# Altium footprint library connector.PcbLib: 189 footprints (part 4 of 12)
Each footprint in its own frame and in the unit in brackets; x right, y up, seen from the top. Pads: shape width x height; smd on the part's side, far side on the other; paste and mask are expansions set on the pad; w line width, h text height; cw(c..) or ccw(c..) is an arc to the next point about the centre after c.
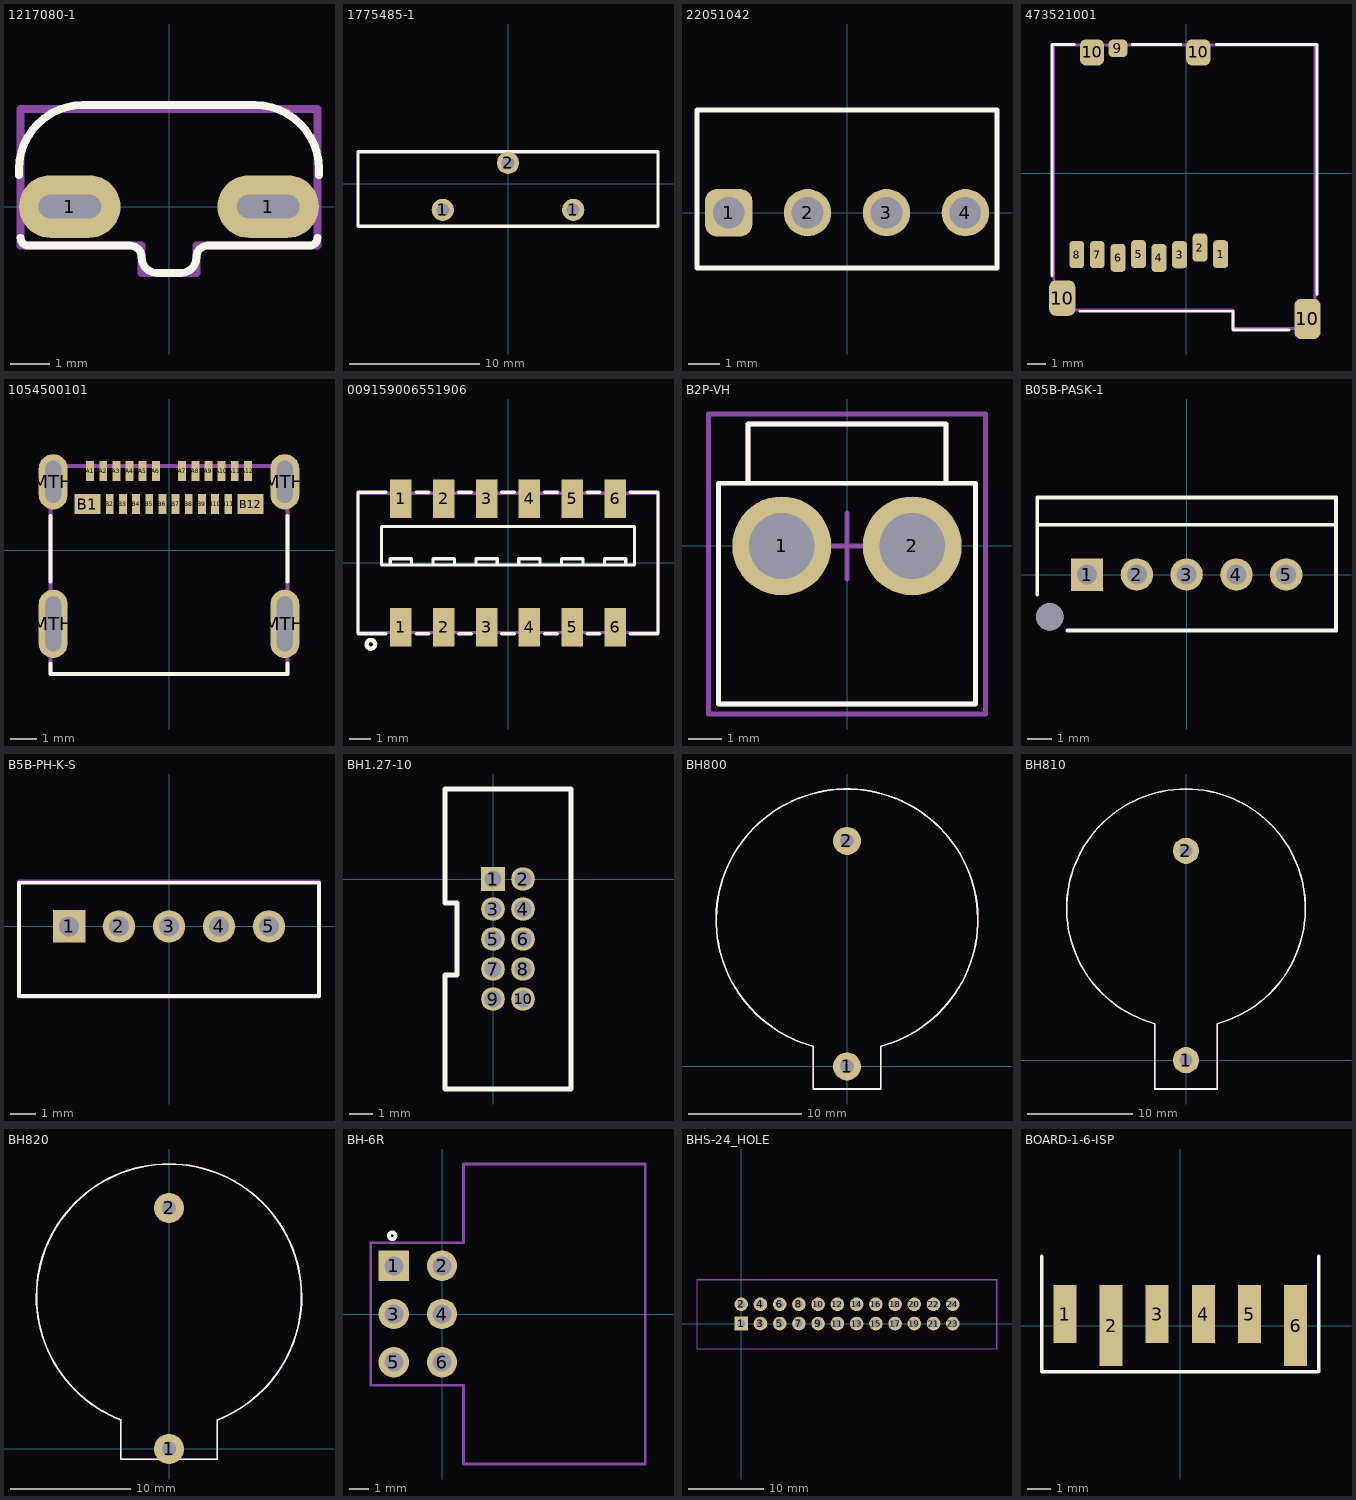
[diagram p3: the footprints below, top view; thin cyan lines are the x and y axes]

## 1217080-1 [mm]
pads (2):
  oval 2.6x1.6 hole 0.6 slot 1.6 at 0 deg: 1(-2.54,0) 1(2.54,0)
Top Overlay:
  lines w0.2: -3.84,0.8 -3.84,0.96 cw(c-2.2,0.96) -2.2,2.6 0.1,2.6 ; -3.8,-0.8 ccw(c-3.6,-0.8) -3.6,-1 -1.24,-1 -1,-1 cw(c-1,-1.3) -0.7,-1.3 ccw(c-0.3,-1.3) -0.3,-1.7 0,-1.7 0.3,-1.7 ccw(c0.3,-1.3) 0.7,-1.3 cw(c1,-1.3) 1,-1 1.24,-1 3.6,-1 ccw(c3.6,-0.8) 3.8,-0.8 ; -0.1,2.6 2.2,2.6 cw(c2.2,0.96) 3.84,0.96 3.84,0.8
Top Courtyard:
  lines w0.2: -3.8,-1 -3.8,2.5 0,2.5 3.8,2.5 3.8,-1 0.7,-1 0.7,-1.7 0,-1.7 -0.7,-1.7 -0.7,-1 -3.8,-1
3D body "1217080-1.stp": height 9.91, standoff -3.81, extent -3.699,-1.675 3.794,2.567

## 1775485-1 [mm]
height 18.5
pads (3):
  round 1.7 hole 1: 1(-5,-2) 1(5,-2) 2(0,1.6)
Top Overlay:
  lines w0.254: -11.5,-3.25 -11.5,0 -11.5,2.45 0.55,2.45 11.5,2.45 11.5,0 11.5,-3.25 -0.25,-3.25 -11.5,-3.25
3D body "User Library-TE_2-1775485-1_CR2032_bat_vert_holder.step": height 18.5, standoff -4, extent -11.5,-3.35 11.5,2.45

## 22051042 [mm]
height 6.3
pads (4):
  rrect50% 1.5x1.5 hole 1: 1(-3.75,0)
  round 1.5 hole 1: 2(-1.25,0) 3(1.25,0) 4(3.75,0)
Top Overlay:
  lines w0.15: -4.75,-1.75 4.75,-1.75 4.75,3.25 4.5,3.25 -4.75,3.25 -4.75,0 -4.75,-1.75
3D body "022051042.stp": height 6.47, standoff -3.25, extent -4.75,-10.1 4.75,3.2

## 473521001 [mm]
pads (13):
  rrect50% 0.8x1.5 smd: 1(1.831,-4.34) 2(0.727,-3.985) 4(-1.473,-4.538) 5(-2.567,-4.333) 6(-3.665,-4.534)
  rrect50% 0.8x1.45 smd: 3(-0.368,-4.367) 7(-4.779,-4.36) 8(-5.876,-4.356)
  rrect50% 1x0.95 smd: 9(-3.667,6.693)
  rrect50% 1.4x1.9 smd: 10(-6.656,-6.688)
  rrect50% 1.3x1.4 smd: 10(-5.059,6.475) 10(0.64,6.471)
  rrect50% 1.4x2.15 smd: 10(6.485,-7.808)
Top Overlay:
  lines w0.15: -7.2,-5.5 -7.2,6.9 -6,6.9 ; -5.7,-7.4 2.5,-7.4 2.5,-8.4 5.5,-8.4 ; -2.9,6.9 -0.3,6.9 ; 1.6,6.9 7,6.9 7,-6.5
Top Courtyard:
  lines w0.15: -7.11,-7.326 2.5,-7.326 2.5,-8.325 6.892,-8.325 6.892,6.875 -7.11,6.875 -7.11,-7.326
3D body "473521001.stp": height 1.95, standoff 0.07, extent -7.157,-8.273 6.943,6.927

## 1054500101 [mm]
height 3.3
pads (28):
  rect 0.3x0.76 smd: A1(-3,3) A2(-2.5,3) A3(-2,3) A4(-1.5,3) A5(-1,3) A6(-0.5,3) A7(0.5,3) A8(1,3) A9(1.5,3) A10(2,3) A11(2.5,3) A12(3,3) B2(-2.25,1.75) B3(-1.75,1.75) B4(-1.25,1.75) B5(-0.75,1.75) B6(-0.25,1.75) B7(0.25,1.75) B8(0.75,1.75) B9(1.25,1.75) B10(1.75,1.75) B11(2.25,1.75)
  rect 1x0.76 smd: B1(-3.1,1.75) B12(3.1,1.75)
  oval 1.1x2.6 hole 0.6 slot 2.1 at 90 deg: MTH(-4.4,-2.8) MTH(4.4,-2.8)
  oval 1.1x2.1 hole 0.6 slot 1.6 at 90 deg: MTH(-4.4,2.6) MTH(4.4,2.6)
Top Overlay:
  lines w0.15: -4.5,-4.3 -4.5,-4.7 0,-4.7 4.5,-4.7 4.5,-4.3 ; -4.5,-1.2 -4.5,1.3 ; 4.5,-1.2 4.5,1.3
Top Courtyard:
  lines w0.15: -4.5,-4.7 -4.5,3.2 4.5,3.2 4.5,-4.7 -4.5,-4.7
3D body "1054500101.stp": height 3.18, standoff -0.78, extent -4.47,-4.7 4.47,3.2

## 009159006551906 [mm]
height 5
pads (12):
  rect 1x1.8 smd: 1(-5,-3) 1(-5,3) 2(-3,-3) 2(-3,3) 3(-1,-3) 3(-1,3) 4(1,-3) 4(1,3) 5(3,-3) 5(3,3) 6(5,-3) 6(5,3)
Top Overlay:
  circle w0.2: c-6.4,-3.8 r0.2
  lines w0.15: -5.7,-3.3 -7,-3.3 -7,0.1 -7,3.3 -5.7,3.3 ; -5.487,-0.1 -5.5,-0.1 -5.5,0.2 -4.5,0.2 -4.5,-0.1 ; -4.3,-3.3 -3.7,-3.3 ; -4.3,3.3 -3.7,3.3 ; -3.5,-0.1 -3.5,0.2 -2.5,0.2 -2.5,-0.1 ; -2.3,-3.3 -1.7,-3.3 ; -2.3,3.3 -1.7,3.3 ; -1.5,-0.1 -1.5,0.2 -0.5,0.2 -0.5,-0.1 ; -0.3,-3.3 0.3,-3.3 ; -0.3,3.3 0.3,3.3 ; 0.5,-0.1 0.5,0.2 1.5,0.2 1.5,-0.1 ; 1.7,-3.3 2.3,-3.3 ; 1.7,3.3 2.3,3.3 ; 2.5,-0.1 2.5,0.2 3.5,0.2 3.5,-0.1 ; 3.7,-3.3 4.3,-3.3 ; 3.7,3.3 4.3,3.3 ; 4.5,-0.1 4.5,0.2 5.5,0.2 5.5,-0.1 ; 5.7,-3.3 7,-3.3 7,0.1 7,3.3 5.7,3.3 ; -5.9,-0.1 -5.9,1.7 0,1.7 5.9,1.7 5.9,-0.1 -0.2,-0.1 -5.9,-0.1
Top Courtyard:
  lines w0.15: -7,-3.25 -7,3.25 7,3.25 7,-3.25 -7,-3.25
3D body "AVX-00-9159-006-551-906.STEP": height 5.1, standoff 0.05, extent -7,-3.75 7,3.75

## B2P-VH [mm]
height 11
pads (2):
  round 3 hole 2: 1(-1.98,0) 2(1.98,0)
Top Overlay:
  lines w0.15: -3,1.9 -3,3.7 3,3.7 3,1.9 ; -3.9,1.9 3.9,1.9 ; -3.9,1.9 -3.9,-4.8 3.9,-4.8 3.9,1.9 ; -3.9,1.9 3.9,1.9
Mechanical 15:
  lines w0.15: -1,0 1,0 ; 0,-1 0,1 ; -4.2,-5.1 4.2,-5.1 4.2,4 -4.2,4 -4.2,-5.1
Mechanical 29:
  lines w0.15: -3,1.9 -3,3.7 3,3.7 3,1.9 ; -3.9,1.9 3.9,1.9 ; -3.9,1.9 -3.9,-4.8 3.9,-4.8 3.9,1.9 ; -3.9,1.9 3.9,1.9
  text ".Designator" at -3,-1.8 h1
3D body "B2P-VH-BK.STEP": height 10.9, standoff -3.7, extent -3.93,-4.65 3.93,3.85

## B05B-PASK-1 [mm]
pads (6):
  rect 1.3x1.3 hole 0.8: 1(-4,0)
  round 1.3 hole 0.8: 2(-2,0) 3(0,0) 4(2,0) 5(4,0)
  round 1.1 hole 1.1 unplated: ""(-5.5,-1.7)
Top Overlay:
  lines w0.15: -6,-0.8 -6,2 ; -4.8,-2.25 6,-2.25 6,2 ; -6,2 -6,3.1 0,3.1 6,3.1 6,2 ; -6,2 6,2
  text "." at -5,2.5 h0.1
3D body "B05B-PASK-1.STEP": height 7.85, standoff -2.85, extent -6,-2.2 6,3.1

## B5B-PH-K-S [mm]
pads (5):
  rect 1.3x1.3 hole 0.8: 1(-4,0)
  round 1.3 hole 0.8: 2(-2,0) 3(0,0) 4(2,0) 5(4,0)
Top Overlay:
  lines w0.15: -6,-2.775 6,-2.775 6,1.75 -6,1.75 -6,-2.775
Top Courtyard:
  lines w0.15: -6,-2.8 -6,1.8 6,1.8 6,-2.8 -6,-2.8
3D body "B5B-PH-K-S.STEP": height 6, standoff -3.4, extent -5.95,-2.75 5.95,1.75

## BH1.27-10 [mm] "BH1.27-10"
pads (10):
  rect 1x1 hole 0.7: 1(0,0)
  round 1 hole 0.7: 2(1.27,0) 3(0,-1.27) 4(1.27,-1.27) 5(0,-2.54) 6(1.27,-2.54) 7(0,-3.81) 8(1.27,-3.81) 9(0,-5.08) 10(1.27,-5.08)
Top Overlay:
  lines w0.2: -2.032,-8.89 -2.032,-4.064 -1.524,-4.064 -1.524,-1.016 -2.032,-1.016 -2.032,3.81 3.302,3.81 3.302,-8.89 -2.032,-8.89
3D body "CONB127P-2R-10W_TH.STEP": height 5.4, standoff -2.1, extent -2.015,-8.865 3.185,3.785

## BH800 [mm]
height 6.6
pads (2):
  round 2.5 hole 1.2: 1(0,0) 2(0,20)
Top Overlay:
  lines w0.15: -3.001,1.795 cw(c0,13) 3.001,1.795 ; -3,1.8 -3,-2 3,-2 3,1.8
Top Courtyard:
  lines w0.15: -3.001,1.795 cw(c0,13) 3.001,1.795 ; -3,1.8 -3,-2 3,-2 3,1.8
3D body: height 8.2, standoff 0, extent -11.6,1.403 11.6,24.597
3D body: height 8.2, standoff 0, extent -3,-2 3,3.5

## BH810 [mm]
height 6.6
pads (2):
  round 2.5 hole 1.2: 1(0,0) 2(0,20)
Top Overlay:
  lines w0.15: -3,3.5 -3,-2.75 3,-2.75 3,3.5 ; -3,3.502 cw(c0,14.5) 3,3.502
Top Courtyard:
  lines w0.15: -3,3.5 -3,-2.75 3,-2.75 3,3.5 ; -3,3.502 cw(c0,14.5) 3,3.502
3D body "User Library-BATTERY HOLDER CR2032.step": height 7.41, standoff -3.5, extent -11.5,-2.75 11.5,25.75

## BH820 [mm]
height 6.6
pads (2):
  round 2.5 hole 1.2: 1(0,0) 2(0,20)
Top Overlay:
  lines w0.15: -4,2.35 -4,-0.85 4,-0.85 4,2.35 ; -3.982,2.396 cw(c0,12.65) 4.016,2.409
Top Courtyard:
  lines w0.15: -4,2.396 -4,-0.85 4,-0.85 4,2.396 ; -3.998,2.402 cw(c0,12.65) 3.998,2.402
3D body: height 8.5, standoff 0, extent -4,-0.847 4,2.353
3D body: height 8.5, standoff 0, extent -11.4,0.753 11.4,23.547

## BH-6R [mm] "BH-6R(IDC-6R)"
height 7
pads (6):
  rect 1.6x1.6 hole 1: 1(-2.54,2.54)
  round 1.6 hole 1: 2(0,2.54) 3(-2.54,0) 4(0,0) 5(-2.54,-2.54) 6(0,-2.54)
Top Overlay:
  circle w0.2: c-2.625,4.125 r0.175
Top Courtyard:
  lines w0.15: -3.75,-3.75 -3.75,0 -3.75,3.75 1.125,3.75 1.125,7.9 10.7,7.9 10.7,0 10.7,-7.9 1.125,-7.9 1.125,-3.75 -3.75,-3.75
3D body "User Library-IDC Socket Male 6pin Angled THT Goldplated 2_54mm.step": height 8.85, standoff -2.5, extent -2.86,-7.93 10.7,7.93

## BHS-24_HOLE [mm]
pads (24):
  rect 1.8x1.8 hole 1: 1(0,0)
  round 1.8 hole 1: 2(0,2.54) 3(2.54,0) 4(2.54,2.54) 5(5.08,0) 6(5.08,2.54) 7(7.62,0) 8(7.62,2.54) 9(10.16,0) 10(10.16,2.54) 11(12.7,0) 12(12.7,2.54) 13(15.24,0) 14(15.24,2.54) 15(17.78,0) 16(17.78,2.54) 17(20.32,0) 18(20.32,2.54) 19(22.86,0) 20(22.86,2.54) 21(25.4,0) 22(25.4,2.54) 23(27.94,0) 24(27.94,2.54)
Mechanical 29:
  circle w0.15: c0,0 r0.554
  lines w0.15: -5.842,-3.302 -5.842,5.842 33.782,5.842 33.782,-3.302 -5.842,-3.302 ; -5.8,-3.325 33.725,-3.325 33.725,5.8 -5.8,5.8 -5.8,-3.325
  text ".Designator" at 10.5,0.7 h1
3D body "IDC-24MS.STEP": height 9.1, standoff -3, extent -4.99,-3.275 33.09,6.325

## BOARD-1-6-ISP [mm]
pads (6):
  rect 1x2.5 smd: 1(-5,0.5) 3(-1,0.5) 4(1,0.5) 5(3,0.5)
  rect 1x3.5 smd: 2(-3,0) 6(5,0)
Top Overlay:
  lines w0.15: -6,3 -6,-2 6,-2 6,3